# Altium schematic symbol library GyokuRe.SchLib: 1131 symbols (part 4 of 8) (continued)
## ICL7107 (continued)

## ICS307-02
designator U?
Serially Programmable Clock Source; Vendor: Digikey; Published: 5-Jan-2004; DatasheetDocument: 03-Jun-2003; Publisher: Altium Limited; ComponentLink1Description: Digikey Part Link; ComponentLink2Description: Open Datasheet; ComponentLink2URL: H:\LIBRARY\LIBRARY.Datasheet\
footprint SO-G16 (Small Outline; 16 Leads; Body Width 3.5 mm; Pitch 1.27 mm)
pcadlib SO-G16 (Small Outline; 16 Leads; Body Width 3.5 mm; Pitch 1.27 mm)
pins: 1 X1/CLK (in) "Reference Word Devider Input", 2 NC "Reference Word Devider Input", 3 VDD (power) "Positive Supply, 3V3 or 5V", 4 NC, 5 GND (power), 6 CLK2 (out) "Fixed Clock Ref", 7 NC "Crystal connection", 8 SCLK (in) "Serial Programming Clock", 9 STROBE (in) "Serial Programming Strobe", 10 NC, 11 CLK1 (out) "Variable Clock Output", 12 DATA (in) "Serial Programming Data", 13 PDT~{S} (in) "Low = TriState CLK1 and CLK2 and Power Down", 14 NC, 15 NC, 16 X2 (in) "Crystal Terminal"

## ICS552-02_0
designator U?
ComponentLink1Description: Digikey Part Link; ComponentLink2Description: Open Datasheet; ComponentLink2URL: H:\LIBRARY\LIBRARY.Datasheet\
footprint 8_LEAD_SOIC
pins: 1 OE (in), 2 VDD (power), 3 Q0 (out), 4 Q1 (out), 5 Q2 (out), 6 Q3 (out), 7 GND (power), 8 INB (in), 9 INA (in), 10 GND (power), 11 Q4 (out), 12 Q5 (out), 13 Q6 (out), 14 Q7 (out), 15 VDD (power), 16 SELA (in)

## ICSP-PIC
designator P?
Header, 5-Pin; LatestRevisionDate: 17-Jul-2002; LatestRevisionNote: Re-released for DXP Platform.; Publisher: Altium Limited
footprint HDR1X5 (Connector; Header; 5 Position)
signal-integrity model Connector
pins: 1 MCLR, 2 VCC, 3 GND, 4 PGD, 5 PGC

## ICSP-PSOC
designator P?
ICSP 5 pin - PSoC; LatestRevisionDate: 17-Jul-2002; LatestRevisionNote: Re-released for DXP Platform.; Publisher: Altium Limited
footprint HDR1X5 (Connector; Header; 5 Position)
signal-integrity model Connector
pins: 1 VCC, 2 GND, 3 XRES, 4 CLK, 5 SDA

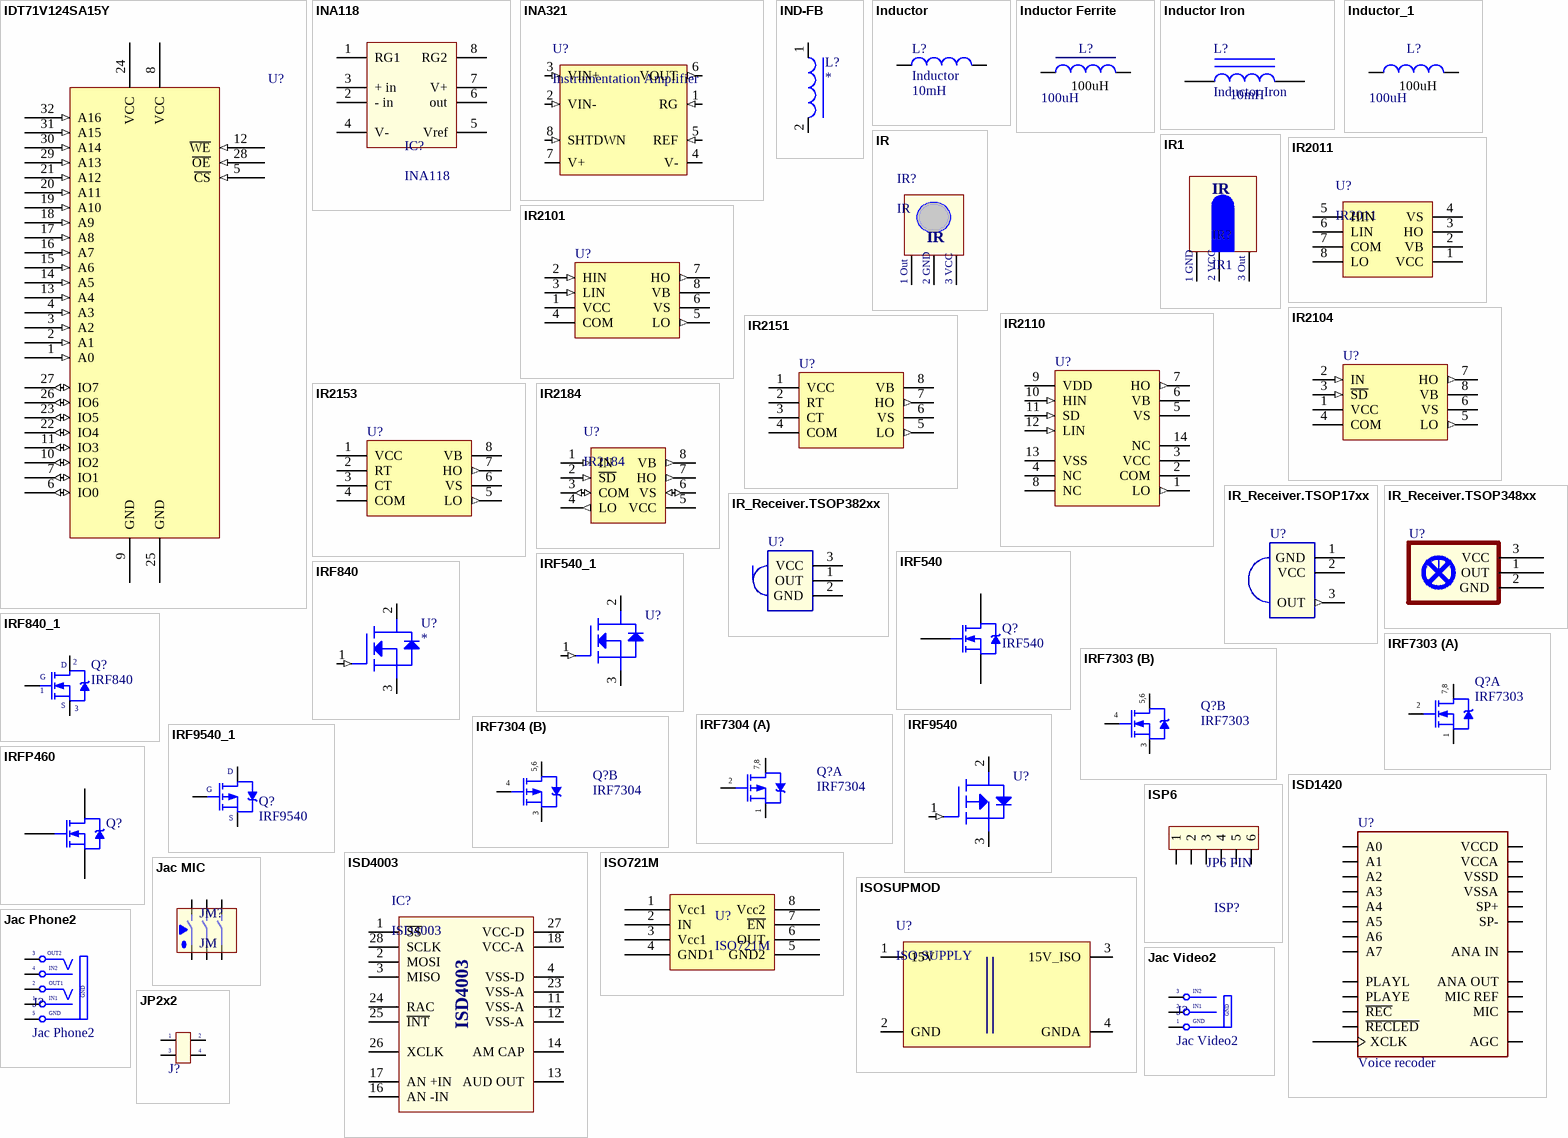
[diagram p24: symbols IDT71V124SA15Y to JP2x2]

## IDT71V124SA15Y
designator U?
CMOS Static RAM, 3.3V, 128K x 8 bit; Vendor: Digikey; Published: 5-Jan-2004; DatasheetDocument: 30-Nov-2003; Publisher: Altium Limited; ComponentLink1Description: Digikey Part Link; ComponentLink2Description: Open Datasheet; ComponentLink2URL: H:\LIBRARY\LIBRARY.Datasheet\
footprint SO-J32 (SOJ; 32 Leads; Body Width 7.5 mm; Pitch 1.27 mm)
pcadlib SO-J32 (SOJ; 32 Leads; Body Width 7.5 mm; Pitch 1.27 mm)
pins: 1 A0 (in) "Address 0", 2 A1 (in) "Address 1", 3 A2 (in) "Address 3", 4 A3 (in) "Address 3", 5 ~{CS} (in) "Chip Select", 6 IO0 (io) "Data 0", 7 IO1 (io) "Data 1", 8 VCC (power) "Pos Supply", 9 GND (power), 10 IO2 (io) "Data 2", 11 IO3 (io) "Data 3", 12 ~{WE} (in) "Write Enable", 13 A4 (in) "Address 4", 14 A5 (in) "Address 5", 15 A6 (in) "Address 6", 16 A7 (in) "Address 7", 17 A8 (in) "Address 8", 18 A9 (in) "Address 9", 19 A10 (in) "Address 10", 20 A11 (in) "Address 11", 21 A12 (in) "Address 12", 22 IO4 (io) "Data 4", 23 IO5 (io) "Data 5", 24 VCC (power) "Pos Supply", 25 GND (power), 26 IO6 (io) "Data 6", 27 IO7 (io) "Data 7", 28 ~{OE} (in) "Output Enable", 29 A13 (in) "Address 13", 30 A14 (in) "Address 14", 31 A15 (in) "Address 15", 32 A16 (in) "Address 16"

## INA118
designator IC?
Precision, Low Power  INSTRUMENTATION AMPLIFIER; Designed by: VanDungEvn; Value: INA118
footprint DIP8/W0.3 (8 PIN, W 300mil, Pin to pin 100mil)
pins: 1 RG1, 2 - in, 3 + in, 4 V-, 5 Vref, 6 out, 7 V+, 8 RG2

## INA321
designator U?, comment Instrumentation Amplifier
microPower, Single-Supply, CMOS Instrumentation Amplifier; Manufacturer: Texas Instrument; Vendor: Digikey; Publisher: Hoang Nguyen; ComponentLink1Description: Digikey Part Link; ComponentLink1URL: http://search.digikey.com/scripts/DkSearch/dksus.dll?Detail&name=INA321EACT-ND; ComponentLink2URL: H:\LIBRARY\LIBRARY.Datasheet\ina321.pdf; ComponentLink2Description: Open Datasheet; Price: 2.7 [USD]; Published: 13-April-2009
footprint SOP8.S-PDSO-G8
pins: 1 RG (in), 2 VIN- (in), 3 VIN+ (in), 4 V- (power), 5 REF (in), 6 VOUT (out), 7 V+ (power), 8 SHTDWN (in)

## IND-FB
designator L?
ComponentLink1Description: Digikey Part Link; ComponentLink2Description: Open Datasheet; ComponentLink2URL: H:\LIBRARY\LIBRARY.Datasheet\
pins: 1, 2

## Inductor
designator L?  value 10mH
Code_IEC: 1005; Published: 8-Jun-2000; LatestRevisionDate: 17-Jul-2002; LatestRevisionNote: Re-released for DXP Platform.; PackageReference: 0402-A; Publisher: Altium Limited; Code_JEITA: 0402
footprint Inductor 5A (Inductor 5A; Solder Pad 35mil)
footprint L-0805 (Chip Inductor; Body 2.0 x 1.3 mm (LxW typ))
footprint Coil (Ferrite Coil; Filter; Solder Pad 35mil)
pins: 1, 2

## Inductor Ferrite
designator L?, comment 100uH
Cuon Cam L; Code_IEC: 1005; Vendor: Digikey; Published: 8-Jun-2000; LatestRevisionDate: 17-Jul-2002; LatestRevisionNote: Re-released for DXP Platform.; PackageReference: 0402-A; Publisher: Altium Limited; Code_JEITA: 0402; ComponentLink1Description: Digikey Part Link; ComponentLink2Description: Open Datasheet; ComponentLink2URL: H:\LIBRARY\LIBRARY.Datasheet\; Value: 100uH
signal-integrity model Inductor
footprint IMPESMD1
footprint Cuon day ferrite
footprint loi ferrit 2A (Body round radial diam 7.5mm - hight 9.5mm)
footprint ferrite bead (Res 8mm*2mm)
footprint IMPE6 (Body 8.0x5.6 mm Radial - 200 mils)
pins: 1, 2

## Inductor Iron
designator L?  value 10mH
Magnetic-Core Inductor; Published: 24-Mar-1999; LatestRevisionDate: 17-Jul-2002; LatestRevisionNote: Re-released for DXP Platform.; PackageReference: AXIAL-0.9; Publisher: Altium Limited
pins: 1, 2

## Inductor_1
designator L?, comment 100uH
Cuon Cam L; Code_IEC: 1005; Vendor: Digikey; Published: 8-Jun-2000; LatestRevisionDate: 17-Jul-2002; LatestRevisionNote: Re-released for DXP Platform.; PackageReference: 0402-A; Publisher: Altium Limited; Code_JEITA: 0402; ComponentLink1Description: Digikey Part Link; ComponentLink2Description: Open Datasheet; ComponentLink2URL: H:\LIBRARY\LIBRARY.Datasheet\; Value: 100uH
signal-integrity model Inductor
footprint IMPE1 (Body 23x10 mm Horiz. - 900 mils)
footprint IMPE2 (Body 10x7.5 mm Horiz. - 600 mils)
footprint IMPE3 (Body 7.6x4.9 mm Radial - 300 mils)
footprint IMPE4 (Body 7.6x5.5 mm Radial - 250 mils)
footprint IMPE5 (Body 7.3x4.4 mm Radial - 200 mils)
footprint IMPE6 (Body 8.0x5.6 mm Radial - 200 mils)
footprint IMPE7-RS1 (Body round radial diam 7.5mm - hight 9.5mm)
footprint IMPE8-RS2 (Body round radial diam 10mm - hight 18mm)
footprint IMPESMD1
footprint L2012-0805 (Inductor Chip 0805 package)
footprint L1608-0603 (Inductor Chip 0603 package)
footprint Cuon day ferrite
pins: 1, 2

## IR
designator IR?
Receiver Infraed IC
footprint IR (Receiver Infared IC)
pins: 1 Out, 2 GND, 3 VCC
text: 1 Out; 2 GND; 3 VCC

## IR1
designator IR?
Receiver Infraed IC
footprint IR2 (Receiver Infared IC)
pins: 1 Out, 2 GND, 3 VCC
text: IR; 1 GND; 2 VCC; 3 Out

## IR2011
designator U?
HALF-BRIDGE DRIVER; Voffset: 600V(max); IO+/-: 130mA/270mA; Vout: 10-20V; Deadtime: 520ns; Input logic: 3V3/5V/15V
footprint Dip8 (Dual Inline Package 8 pins)
footprint dip8N (Dual Inline Package 8 pins)
footprint SOIC8N
pins: 1 VCC (power), 2 VB (power), 3 HO (power), 4 VS (power), 5 HIN (power), 6 LIN (power), 7 COM (power), 8 LO (power)

## IR2101
designator U?
High and Low Side Driver; Published: 8-Jun-2000; LatestRevisionDate: 04-Mar-2005; LatestRevisionNote: Stylized 3D Model Added.; DatasheetDocument: PD60043J; PackageReference: PDIP8; Publisher: Altium Limited; Code_JEDEC: MO-001-AN; ComponentLink1Description: Manufacturer Link; ComponentLink1URL: http://www.irf.com/
footprint DIP-8 (DIP, 8-Pin, Row Spacing 7.62 mm, Pitch 2.54 mm)
pins: 1 VCC (power), 2 HIN (in), 3 LIN (in), 4 COM (power), 5 LO (out), 6 VS (power), 7 HO (out), 8 VB (power)

## IR2104
designator U?
High and Low Side Driver; Published: 8-Jun-2000; LatestRevisionDate: 04-Mar-2005; LatestRevisionNote: Stylized 3D Model Added.; DatasheetDocument: PD600461; PackageReference: PDIP8; Publisher: Altium Limited; Code_JEDEC: MO-001-AN; ComponentLink1Description: Manufacturer Link; ComponentLink1URL: http://www.irf.com/; ComponentLink2Description: Datasheet; ComponentLink2URL: http://www.irf.com/product-info/datasheets/data/ir2104.pdf
footprint DIP-8 (DIP, 8-Pin, Row Spacing 7.62 mm, Pitch 2.54 mm)
pins: 1 VCC (power), 2 IN (in), 3 ~{SD} (in), 4 COM (power), 5 LO (out), 6 VS (power), 7 HO (out), 8 VB (power)

## IR2110
designator U?
High and Low Side Driver; Note: Pins 4, 8 and 14 are not connected; Published: 8-Jun-2000; LatestRevisionDate: 04-Mar-2005; LatestRevisionNote: Stylized 3D Model Added.; DatasheetDocument: PD60147J; PackageReference: PDIP14; Publisher: Altium Limited; ComponentLink1Description: Manufacturer Link; ComponentLink1URL: http://www.irf.com/; ComponentLink2Description: Datasheet; ComponentLink2URL: http://www.irf.com/product-info/datasheets/data/ir2110.pdf
footprint DIP-14 (DIP, 14-Pin, Row Spacing 7.62 mm, Pitch 2.54 mm)
pins: 1 LO (out), 2 COM (power), 3 VCC (power), 4 NC, 5 VS (power), 6 VB (power), 7 HO (out), 8 NC, 9 VDD (power), 10 HIN (in), 11 SD (in), 12 LIN (in), 13 VSS (power), 14 NC

## IR2151
designator U?
Self-Oscillating Half-Bridge Driver; Published: 8-Jun-2000; LatestRevisionDate: 04-Mar-2005; LatestRevisionNote: Stylized 3D Model Added.; DatasheetDocument: Mar-1999; PackageReference: PDIP8; Publisher: Altium Limited; Code_JEDEC: MO-001-AN; ComponentLink1Description: Manufacturer Link; ComponentLink1URL: http://www.irf.com/; ComponentLink2Description: Datasheet; ComponentLink2URL: http://www.irf.com/product-info/datasheets/data/ir2151.pdf
footprint DIP-8 (DIP, 8-Pin, Row Spacing 7.62 mm, Pitch 2.54 mm)
pins: 1 VCC (power), 2 RT, 3 CT, 4 COM (power), 5 LO (out), 6 VS (power), 7 HO (out), 8 VB (power)

## IR2153
designator U?
Self-Oscillating Half-Bridge Driver; Published: 8-Jun-2000; LatestRevisionDate: 04-Mar-2005; LatestRevisionNote: Stylized 3D Model Added.; DatasheetDocument: PD60062J; PackageReference: PDIP8; Publisher: Altium Limited; Code_JEDEC: MO-001-AN; ComponentLink1Description: Manufacturer Link; ComponentLink1URL: http://www.irf.com/; ComponentLink2Description: Datasheet; ComponentLink2URL: http://www.irf.com/product-info/datasheets/data/ir2153.pdf
footprint DIP-8 (DIP, 8-Pin, Row Spacing 7.62 mm, Pitch 2.54 mm)
pins: 1 VCC (power), 2 RT, 3 CT, 4 COM (power), 5 LO (out), 6 VS (power), 7 HO (out), 8 VB (power)

## IR2184
designator U?
HALF-BRIDGE DRIVER; Voffset: 600V(max); IO+/-: 130mA/270mA; Vout: 10-20V; Deadtime: 520ns; Input logic: 3V3/5V
footprint Dip8 (Dual Inline Package 8 pins)
footprint dip8N (Dual Inline Package 8 pins)
footprint SOIC8N
pins: 1 IN (in), 2 ~{SD} (in), 3 COM (io), 4 LO (out), 5 VCC (power), 6 VS (io), 7 HO (out), 8 VB (out)

## IR_Receiver.TSOP17xx
designator U?  (value not drawn)
Mat Thu tia hong ngoai TSOP17xx; Manufacturer: Vishay Semiconductors; Vendor: Digikey; Value: TSOP1738 38Khz; Published: 13-April-2009; Publisher: Hoang Nguyen; ComponentLink1Description: Digikey Part Link; ComponentLink2Description: Open Datasheet; ComponentLink2URL: H:\LIBRARY\LIBRARY.Datasheet\TSOP 17...pdf; Price: 500 VND
footprint ir receiver (IR Receiver)
pins: 1 GND (power), 2 VCC (power), 3 OUT (out)

## IR_Receiver.TSOP348xx
designator U?  (value not drawn)
Mat Thu tia hong ngoai TSOP348xx; Manufacturer: Vishay Semiconductors; Vendor: Digikey; Value: TSOP34840 - 40Khz; Published: 13-April-2009; Publisher: Hoang Nguyen; ComponentLink1Description: Digikey Part Link; ComponentLink2Description: Open Datasheet; ComponentLink2URL: H:\LIBRARY\LIBRARY.Datasheet\TSOP348xx.pdf
pins: 1 OUT, 2 GND (power), 3 VCC (power)

## IR_Receiver.TSOP382xx
designator U?  (value not drawn)
Mat Thu tia hong ngoai TSOP382xx; Manufacturer: Vishay Semiconductors; Vendor: Digikey; Value: TSOP38238 - 38Khz; Published: 13-April-2009; Publisher: Hoang Nguyen; ComponentLink1Description: Digikey Part Link; ComponentLink2Description: Open Datasheet; ComponentLink2URL: H:\LIBRARY\LIBRARY.Datasheet\TSOP382xx.pdf
pins: 1 OUT, 2 GND (power), 3 VCC (power)

## IRF540
designator Q?
HEXFET N-Channel Power MOSFET; Note: Pin 2 is electrically connected to pin 4.; Published: 8-Jun-2000; LatestRevisionDate: 17-Jul-2002; LatestRevisionNote: Re-released for DXP Platform.; DatasheetVersion: PD-9.373H; PackageVersion: Feb-1997; PackageReference: TO-220AB; Publisher: Altium Limited; PackageDescription: TO, Thru-Hole, Vertical, Heatsink Mounted; 3 In-Line Leads; Pitch 2.54 mm; ComponentLink1Description: Manufacturer Link; ComponentLink1URL: http://www.irf.com/
footprint TO-220-3 (TO-220; 3 Leads; Solder Pad 35mil)
footprint TO-220-3-Heatsink (TO-220; Heatsink; 3 Leads; Solder Pad 35mil)
pins: 1 G, 2 D, 3 S

## IRF540_1
designator U?  (value not drawn)
IRF9540 - N-CHANNEL POWER MOSFETS; Vendor: Digikey; Publisher: Hoang Nguyen; Price: 7.000 VND; ComponentLink2Description: Open Datasheet; ComponentLink2URL: H:\LIBRARY\LIBRARY.Datasheet\IRF540.pdf; Published: 13-April-2009; ComponentLink1Description: Digikey Part Link
footprint TO-263
footprint TO-220
footprint TO-220N
footprint TO220_Horizontal (TO, Thru-Hole, Horizontal Heatsink Mounted; 3 In-Line Leads; Pitch 2.54 mm)
footprint TO220_Hor_N (TO, Thru-Hole, Horizontal Heatsink Mounted; 3 In-Line Leads; Pitch 2.54 mm)
pins: 1 G (in), 2 D, 3 S

## IRF840
designator U?
Power FET; Vendor: Digikey; Published: 13-April-2009; Publisher: Hoang Nguyen; ComponentLink1Description: Digikey Part Link; ComponentLink2Description: Open Datasheet; ComponentLink2URL: H:\LIBRARY\LIBRARY.Datasheet\
pins: 1 G (in), 2 D, 3 S

## IRF840_1
designator Q?, comment IRF840
MOSFET N - CHANNEL 500V - 0.75 - 8A - TO-220; Value: IRF840
footprint QTO-220 (TO-220 - 1-2-3)
pins: 1 G, 2 D, 3 S

## IRF7303
designator Q?
HEXFET Power MOSFET; Published: 8-Jun-2000; LatestRevisionDate: 13-Apr-2006; LatestRevisionNote: IPC-7351 Footprint Added.; DatasheetVersion: Aug-1997; PackageVersion: Feb-2001; PackageReference: SO-8; Publisher: Altium Limited; PackageDescription: 8-Pin Plastic Small Outline Integrated Circuit 1.27 mm Pitch; Code_JEDEC: MS-012-AA; Code_IPC: SOIC127P600-8; ComponentLink1Description: Manufacturer Link; ComponentLink1URL: http://www.irf.com/; ComponentLink2Description: Datasheet; ComponentLink2URL: http://www.irf.com/product-info/datasheets/data/irf7303.pdf
footprint SO-8 (8-Pin Small Outline Integrated Circuit 1.27 mm Pitch, IPC Medium Density)
simulation model IRF7303 (SUBCKT)
part A pins: 1 S, 2 G, 7 D, 8 D
part B pins: 3 S, 4 G, 5 D, 6 D
part A text: 7,8
part B text: 5,6

## IRF7304
designator Q?
HEXFET Power MOSFET; Published: 8-Jun-2000; LatestRevisionDate: 13-Apr-2006; LatestRevisionNote: IPC-7351 Footprint Added.; DatasheetVersion: Aug-1997; PackageVersion: Feb-2001; PackageReference: SO-8; Publisher: Altium Limited; PackageDescription: 8-Pin Plastic Small Outline Integrated Circuit 1.27 mm Pitch; Code_JEDEC: MS-012-AA; Code_IPC: SOIC127P600-8; ComponentLink1Description: Manufacturer Link; ComponentLink1URL: http://www.irf.com/; ComponentLink2Description: Datasheet; ComponentLink2URL: http://www.irf.com/product-info/datasheets/data/irf7304.pdf
footprint SO-8 (8-Pin Small Outline Integrated Circuit 1.27 mm Pitch, IPC Medium Density)
simulation model IRF7304 (SUBCKT)
part A pins: 1 S, 2 G, 7 D, 8 D
part B pins: 3 S, 4 G, 5 D, 6 D
part A text: 7,8
part B text: 5,6

## IRF9540
designator U?  (value not drawn)
IRF9540 - P-CHANNEL POWER MOSFETS; Vendor: Digikey; Publisher: Hoang Nguyen; Price: 7.000 VND; ComponentLink2Description: Open Datasheet; ComponentLink2URL: H:\LIBRARY\LIBRARY.Datasheet\IRF9540.pdf; Published: 13-April-2009; ComponentLink1Description: Digikey Part Link
footprint TO-263
footprint TO-220
footprint TO-220N
footprint TO220_Horizontal (TO, Thru-Hole, Horizontal Heatsink Mounted; 3 In-Line Leads; Pitch 2.54 mm)
footprint TO220_Hor_N (TO, Thru-Hole, Horizontal Heatsink Mounted; 3 In-Line Leads; Pitch 2.54 mm)
pins: 1 G (in), 2 D, 3 S

## IRF9540_1
designator Q?, comment IRF9540
HEXFET P-Channel Power MOSFET; Note: Pin 2 is electrically connected to pin 4.; Published: 8-Jun-2000; LatestRevisionDate: 17-Jul-2002; LatestRevisionNote: Re-released for DXP Platform.; DatasheetVersion: PD-9.421C; PackageVersion: Feb-1997; PackageReference: TO-220AB; Publisher: Altium Limited; PackageDescription: TO, Thru-Hole, Vertical, Heatsink Mounted; 3 In-Line Leads; Pitch 2.54 mm; ComponentLink1Description: Manufacturer Link; ComponentLink1URL: http://www.irf.com/; ComponentLink2Description: Datasheet; ComponentLink2URL: http://www.irf.com/product-info/datasheets/data/irf9540.pdf
footprint QTO-220 (TO-220 - 1-2-3)
simulation model IRF9540 (SUBCKT)
pins: 1 G, 2 D, 3 S

## IRFP460
designator Q?
HEXFET Power MOSFET; Note: Pin 2 is electrically connected to the Heatsink (4).; Published: 8-Jun-2000; LatestRevisionDate: 17-Jul-2002; LatestRevisionNote: Re-released for DXP Platform.; DatasheetVersion: PD-9.512B; PackageVersion: Aug-1997; PackageReference: TO-247AC; Publisher: Altium Limited; PackageDescription: SIP with Mounting Hole; 3 Leads; Body 20 x 15.6 x 5 mm (typ); Pitch 5.45 mm; Code_JEDEC: TO-247-AC; ComponentLink1Description: Manufacturer Link; ComponentLink1URL: http://www.irf.com/; ComponentLink2Description: Datasheet; ComponentLink2URL: http://www.irf.com/product-info/datasheets/data/irfp460.pdf
footprint TO-247 (TO-247; 3 Leads; Solder Pad 60mil)
simulation model IRFP460 (SUBCKT)
footprint TO-247-V (TO-247; Vertical; 3 Leads; Solder Pad 60mil)
pins: 1 G, 2 D, 3 S

## ISD1420
designator U?, comment Voice recoder
Voice recode / Playback 20-second duration; Manufacturer: Winbond Electronics Corp.; Vendor: TMe; Published: 13-April-2009; Publisher: Hoang Nguyen; ComponentLink1Description: Digikey Part Link; ComponentLink2Description: Open Datasheet; Price: 100.000 VND; ComponentLink2URL: H:\LIBRARY\LIBRARY.Datasheet\ISD1400_Rev1.3.pdf
pins: 1 A0, 2 A1, 3 A2, 4 A3, 5 A4, 6 A5, 9 A6, 10 A7, 12 VSSD (power), 13 VSSA (power), 14 SP+, 15 SP-, 16 VCCA (power), 17 MIC, 18 MIC REF, 19 AGC, 20 ANA IN, 21 ANA OUT, 23 PLAYL, 24 PLAYE, 25 ~{RECLED}, 26 XCLK, 27 ~{REC}, 28 VCCD (power)

## ISD4003
designator IC?
Single-chip voice Record/Playback solution
footprint DIP28/W0.6 (DIP28/W.600, Pin to pin 100mil)
pins: 1 ~{SS}, 2 MOSI, 3 MISO, 4 VSS-D, 11 VSS-A, 12 VSS-A, 13 AUD OUT, 14 AM CAP, 16 AN -IN, 17 AN +IN, 18 VCC-A, 23 VSS-A, 24 RAC, 25 ~{INT}, 26 XCLK, 27 VCC-D, 28 SCLK

## ISO721M
designator U?
3.3-V / 5-V High-speed Digital Isolators
footprint SOIC-8N (SOIC, 8-Leads, Body 4.9x3.9mm, Pitch 1.27mm, IPC High Density)
pins: 1 Vcc1, 2 IN, 3 Vcc1, 4 GND1, 5 GND2, 6 OUT, 7 ~{EN}, 8 Vcc2

## ISOSUPMOD
designator U?, comment ISO SUPPLY
pins: 1 15V, 2 GND, 3 15V_ISO, 4 GNDA

## ISP6
designator ISP?, comment JP6 PIN
ISP6 PIN; Value: JP7
footprint ISP6 (Jac nap PIC)
pins: 1, 2, 3, 4, 5, 6, 7, 8

## Jac MIC
designator JM?, comment JM
Jac Micro; Value: Jac MIC to 6 pin
footprint MIC6 (Footprint not found)
pins: 1, 2, 3, 4, 5, 6

## Jac Phone2
designator J?
Jac Phone Stereo; Creat by: VanDungEvn@Gmail.com
footprint JacPhone2 (Jac Phone Stereo)
footprint JAC_PHONE2 (Jac Phone Stereo)
pins: 1 S1 (power) "Sleeve (Ground)", 2 S1 "Tip Normal (Break Contact)", 3 TN "Tip Normal (Break Contact)", 4 S (power) "Sleeve (Ground)", 5 GND "Tip"
text: OUT2; IN2; OUT1; IN1

## Jac Video2
designator J?
Jac Video Stereo
footprint Jac Video2 (Footprint not found)
pins: 1 GND "Tip", 2 S1 (power) "Sleeve (Ground)", 3 S2 "Tip Normal (Break Contact)"
text: IN2; IN1

## JP2x2
designator J?, comment Jumper 2x2  (value not drawn)
Value: JP 2x2
footprint JP2X2
pins: 1, 2, 3, 4

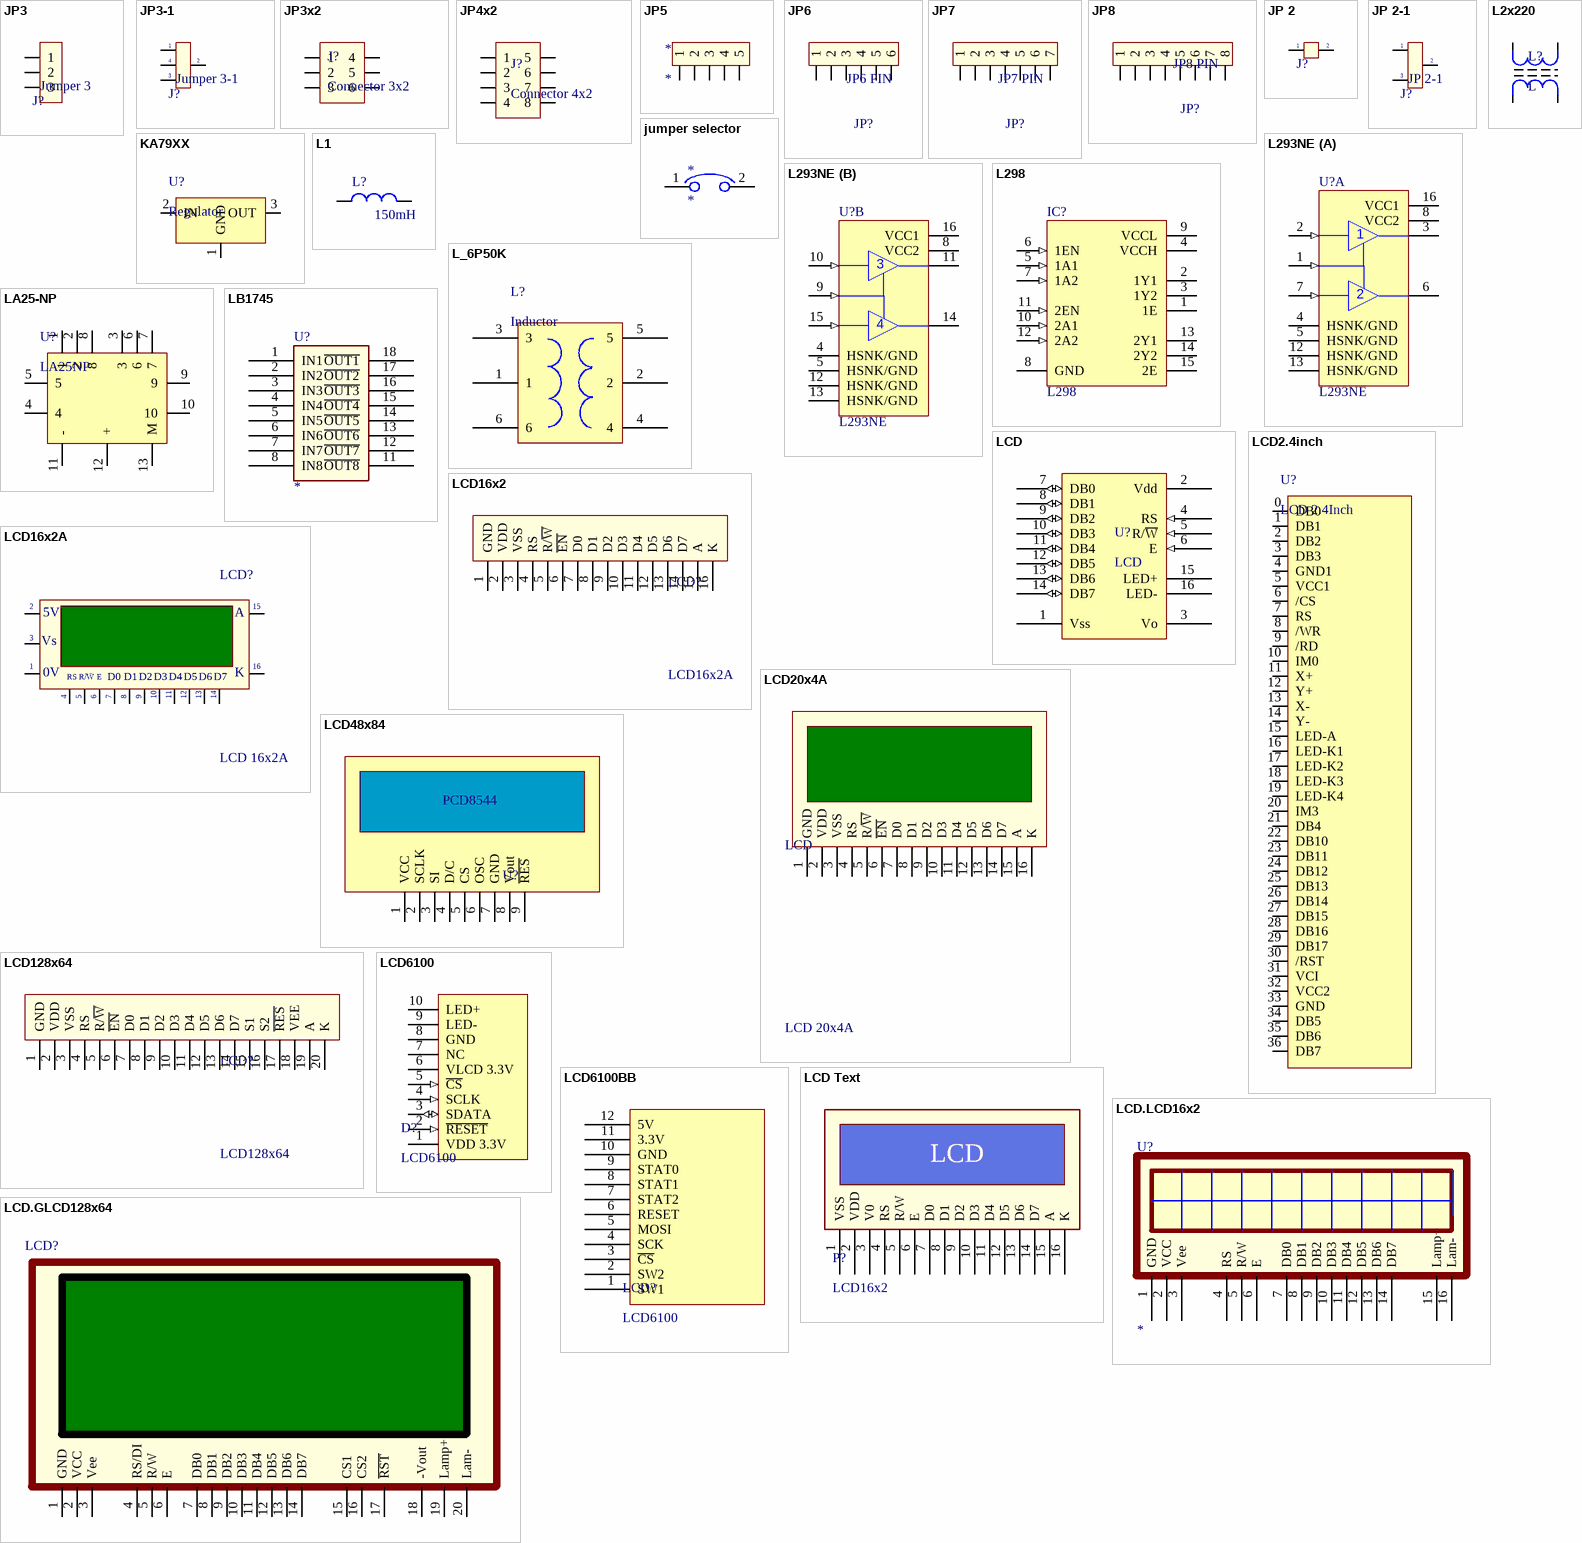
[diagram p25: symbols JP3 to LCD.LCD16x2]

## JP3
designator J?, comment Jumper 3
Value: J3
footprint JP3 (Jumper 3)
footprint JP3H
pins: 1, 2, 3